# Altium footprint library Miscellaneous THD.PcbLib: 216 footprints (part 3 of 15)
Each footprint in its own frame and in the unit in brackets; x right, y up, seen from the top. Pads: shape width x height; smd on the part's side, far side on the other; paste and mask are expansions set on the pad; w line width, h text height; cw(c..) or ccw(c..) is an arc to the next point about the centre after c.
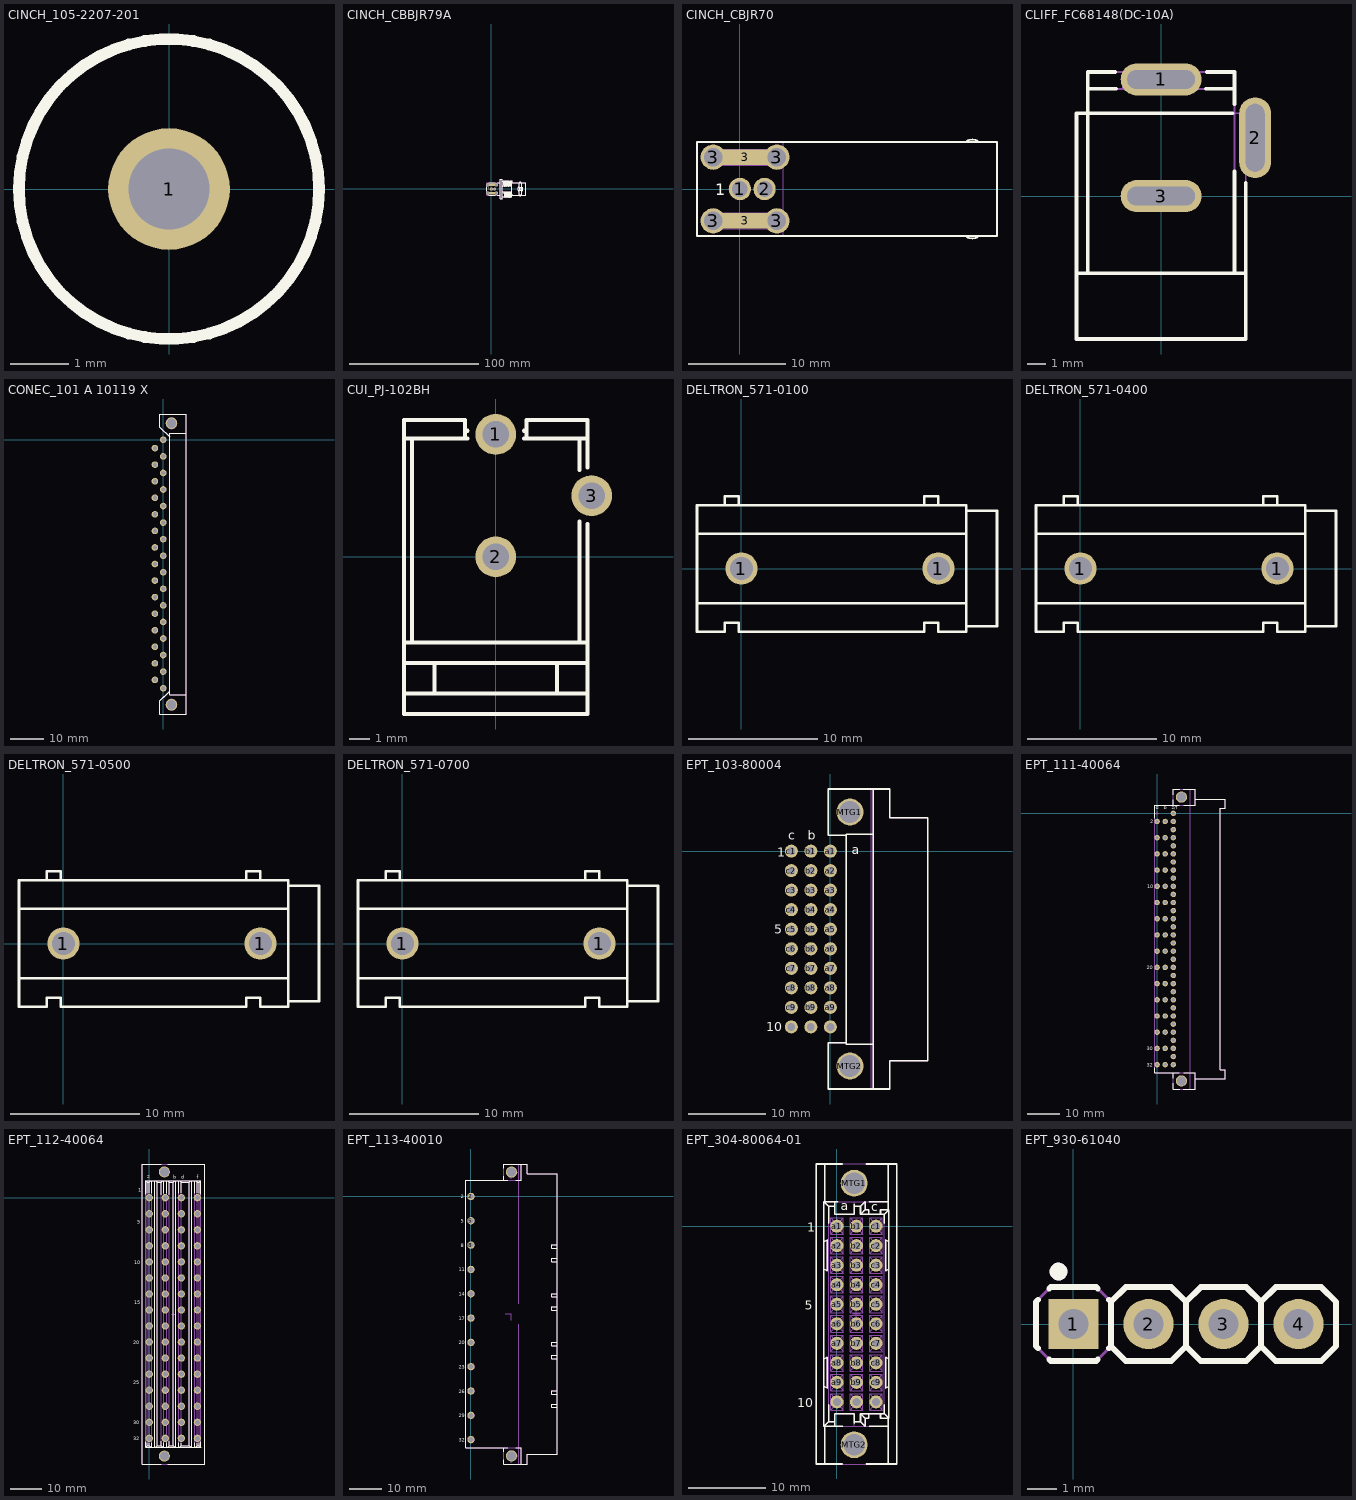
[diagram p2: the footprints below, top view; thin cyan lines are the x and y axes]

## CINCH_105-2207-201 [mm] "Yellow Tip Jack, Vertical For Banana 2mm"
height 8.26
pads (1):
  round 2.1 hole 1.4: 1(0,0)
Top Overlay:
  circle w0.2: c0,0 r2.59
Mechanical 8:
  circle w0.05: c0,0 r0.7
  lines w0.05: 0,0 0,0.5 0,0 ; 0,0 0,-0.5 0,0 ; 0,0 -0.5,0 0,0 ; 0,0 0.5,0 0,0
Mechanical 14:
  circle w0.1: c0,0 r2.59
3D body "CINCH_105-2207-201.stp": height 8.26, standoff -3.48, extent -2.59,-2.59 2.59,2.59

## CINCH_CBBJR79A [mm] "TRB Right Angle PCB Jack"
height 8.636
pads (8):
  round 2.3 hole 1.6: 1(0.2,0) 2(2.74,0)
  round 2.7 hole 2: 3(-2.54,-3.275) 3(-2.54,3.275) 3(4.01,-3.275) 3(4.01,3.275)
  oval 8.55x2 smd paste-1 mask-1: 3(0.733,-3.275) 3(0.733,3.275)
Top Overlay:
  drawing of 163 lines, arcs and shapes, not listed
  text "1" at -2.27,-0.635 h1.2
Mechanical 8:
  lines w0.2: -3.54,-3.275 -1.54,-3.275 ; -3.54,3.275 -1.54,3.275 ; -2.54,-4.275 -2.54,-2.275 ; -2.54,2.275 -2.54,4.275 ; -0.8,0 1.2,0 ; 0.2,-1 0.2,1 ; 0.27,0 2.27,0 ; 0.763,-0.707 2.177,0.707 ; 0.763,0.707 2.177,-0.707 ; 2.74,-1 2.74,1 ; 3.01,-3.275 5.01,-3.275 ; 3.01,3.275 5.01,3.275 ; 4.01,-4.275 4.01,-2.275 ; 4.01,2.275 4.01,4.275
Mechanical 14:
  drawing of 161 lines, arcs and shapes, not listed
  text "1" at -2.27,-0.635 h1.2
3D body "CINCH_CBBJR79A.stp": height 15.5, standoff -3.5, extent -3.289,-7.53 26.697,7.53
3D body "CINCH_CBBJR79A_part2.stp": height 17.38, standoff -1.68, extent 11.789,-8.256 14.147,8.256
3D body "CINCH_CBBJR79A_part3.stp": height 15.97, standoff -0.03, extent 10.945,-7.998 11.745,7.998

## CINCH_CBJR70 [mm] "TRB ( Twinax/Triax 500MHz) Right Angle PCB Jack"
height 10.92
pads (8):
  round 2.3 hole 1.6: 1(0,0) 2(2.54,0)
  round 2.6 hole 1.9: 3(-2.743,-3.277) 3(-2.743,3.277) 3(3.81,-3.277) 3(3.81,3.277)
  oval 8.203x1.6 smd paste-0.8 mask-0.8: 3(0.533,-3.277) 3(0.533,3.277)
Top Overlay:
  lines w0.2: 23.304,-4.826 ccw(c23.603,-4.676) 23.456,-4.976 ccw(c23.927,-3.968) 24.398,-4.976 ccw(c24.253,-4.679) 24.549,-4.826 ; 23.304,4.826 cw(c23.599,4.68) 23.456,4.976 cw(c23.927,3.968) 24.398,4.976 cw(c24.26,4.686) 24.549,4.826 ; -4.413,-4.826 26.467,-4.826 26.467,4.826 -4.413,4.826 -4.413,-4.826
  text "1" at -2.54,-0.635 h1.2
Mechanical 8:
  circle w0.1: c3.81,3.277 r0.825
  circle w0.1: c-2.743,3.277 r0.825
  circle w0.1: c3.81,-3.277 r0.825
  circle w0.1: c-2.743,-3.277 r0.825
  lines w0.1: -3.243,-3.277 -2.743,-3.277 ; -3.243,3.277 -2.743,3.277 ; -2.743,-4.102 3.81,-4.102 ; -2.743,-3.777 -2.743,-3.277 ; -2.743,-2.777 -2.743,-3.277 ; -2.743,-2.452 3.81,-2.452 ; -2.743,2.452 3.81,2.452 ; -2.743,2.777 -2.743,3.277 ; -2.743,3.777 -2.743,3.277 ; -2.743,4.102 3.81,4.102 ; -2.243,-3.277 -2.743,-3.277 ; -2.243,3.277 -2.743,3.277 ; -0.5,0 0,0 ; 0,-0.5 0,0 ; 0,0.5 0,0 ; 0.033,-3.277 0.533,-3.277 ; 0.033,3.277 0.533,3.277 ; 0.5,0 0,0 ; 0.533,-3.777 0.533,-3.277 ; 0.533,-2.777 0.533,-3.277 ; 0.533,2.777 0.533,3.277 ; 0.533,3.777 0.533,3.277 ; 1.033,-3.277 0.533,-3.277 ; 1.033,3.277 0.533,3.277 ; 2.04,0 2.54,0 ; 2.54,-0.5 2.54,0 ; 2.54,0.5 2.54,0 ; 3.04,0 2.54,0 ; 3.31,-3.277 3.81,-3.277 ; 3.31,3.277 3.81,3.277 ; 3.81,-3.777 3.81,-3.277 ; 3.81,-2.777 3.81,-3.277 ; 3.81,2.777 3.81,3.277 ; 3.81,3.777 3.81,3.277 ; 4.31,-3.277 3.81,-3.277 ; 4.31,3.277 3.81,3.277 ; -2.743,-3.785 cw(c-2.743,-3.277) -2.743,-2.769 3.81,-2.769 cw(c3.81,-3.277) 3.81,-3.785 -2.743,-3.785 ; -2.743,2.769 cw(c-2.743,3.277) -2.743,3.785 3.81,3.785 cw(c3.81,3.277) 3.81,2.769 -2.743,2.769
Mechanical 14:
  lines w0.1: 4.443,-4.826 4.443,4.826 ; 23.304,-4.826 ccw(c23.603,-4.676) 23.456,-4.976 ccw(c23.927,-3.968) 24.398,-4.976 ccw(c24.253,-4.679) 24.549,-4.826 ; 23.304,4.826 cw(c23.599,4.68) 23.456,4.976 cw(c23.927,3.968) 24.398,4.976 cw(c24.26,4.686) 24.549,4.826 ; -4.413,-4.826 26.467,-4.826 26.467,4.826 -4.413,4.826 -4.413,-4.826
  text "1" at -2.54,-0.635 h1.2
3D body "CINCH_CBJR70.stp": height 10.92, standoff -3.3, extent -4.413,-5.078 26.467,5.081

## CLIFF_FC68148(DC-10A) [mm] "12V /  5A, 2.1mm Diameter Pin, DC Power Socket With  Switch. DC10A Type"
height 11
pads (3):
  rrect100% 4.3x1.7 hole 1 slot 3.6 at 0 deg: 1(0,6.2) 3(0,0)
  rrect100% 1.7x4.3 hole 1 slot 3.6 at 90 deg: 2(5,3.1)
Top Overlay:
  lines w0.2: -4.5,-4.1 4.5,-4.1 ; -3.9,-4.1 -3.9,6.6 -2.431,6.6 ; -3.9,5.7 -2.391,5.7 ; 2.391,5.7 3.9,5.7 ; 2.431,6.6 3.9,6.6 3.9,4.88 ; 3.8,4.4 -4.5,4.4 -4.5,-7.6 4.5,-7.6 4.5,0.709 ; 3.9,-4.1 3.9,1.32
Mechanical 8:
  lines w0.1: -0.5,0 0,0 ; -0.5,6.2 0,6.2 ; 0,-0.5 0,0 ; 0,0.5 0,0 ; 0,5.7 0,6.2 ; 0,6.7 0,6.2 ; 0.5,0 0,0 ; 0.5,6.2 0,6.2 ; 4.5,3.1 5,3.1 ; 5,2.6 5,3.1 ; 5,3.6 5,3.1 ; 5.5,3.1 5,3.1 ; -1.5,-0.1 -1.5,0.1 1.5,0.1 1.5,-0.1 -1.5,-0.1 ; -1.4,5.7 1.4,5.7 1.4,6.2 -1.4,6.2 -1.4,5.7 ; -1.3,-0.5 cw(c-1.3,0) -1.3,0.5 1.3,0.5 cw(c1.3,0) 1.3,-0.5 -1.3,-0.5 ; -1.3,5.7 cw(c-1.3,6.2) -1.3,6.7 1.3,6.7 cw(c1.3,6.2) 1.3,5.7 -1.3,5.7 ; 4.5,1.8 ccw(c5,1.8) 5.5,1.8 5.5,4.4 ccw(c5,4.4) 4.5,4.4 4.5,1.8
Mechanical 14:
  lines w0.1: -4.5,-4.1 4.5,-4.1 ; -3.9,-4.1 -3.9,6.6 -1.4,6.6 -1.4,6.2 ; -3.9,5.7 3.9,5.7 ; -2.029,5.7 -2.029,6.2 1.971,6.2 1.971,5.7 ; -1.372,6.2 cw(c-1.025,6.15) -1.025,6.5 0.975,6.5 ; 0.967,6.5 cw(c0.967,6.15) 1.314,6.2 ; 1.4,6.2 1.4,6.6 3.9,6.6 3.9,-4.1 ; 4.5,1.9 5.2,1.9 5.2,4.4 -4.5,4.4 -4.5,-7.6 4.5,-7.6 4.5,4.4 ; 5,1.9 5,4.4
3D body "CLIFF_FC68148(DC-10A).stp": height 11, standoff -3.5, extent -4.5,-7.6 5.2,6.6

## CONEC_101 A 10119 X [mm] "DIN 41617, Pitch 2.5mm, 31 Contacts Right-Angled Male Connector"
height 8.5
pads (33):
  round 2 hole 1.3: 1(0,0) 2(-2.5,-2.5) 3(0,-5) 4(-2.5,-7.5) 5(0,-10) 6(-2.5,-12.5) 7(0,-15) 8(-2.5,-17.5) 9(0,-20) 10(-2.5,-22.5) 11(0,-25) 12(-2.5,-27.5) 13(0,-30) 14(-2.5,-32.5) 15(0,-35) 16(-2.5,-37.5) 17(0,-40) 18(-2.5,-42.5) 19(0,-45) 20(-2.5,-47.5) 21(0,-50) 22(-2.5,-52.5) 23(0,-55) 24(-2.5,-57.5) 25(0,-60) 26(-2.5,-62.5) 27(0,-65) 28(-2.5,-67.5) 29(0,-70) 30(-2.5,-72.5) 31(0,-75)
  round 3.5 / inner round 3.5 / far side round 5.1 hole 2.8: MTG1(2.5,5) MTG2(2.5,-80)
Top Overlay:
  lines w0.2: 0.916,-77 -1.1,-78.86 ; 2,-76 -1.1,-78.86 ; 2,1 -1.1,3.86 -1.1,7.8 7,7.8 7,-82.8 -1.1,-82.8 -1.1,-78.86 ; 7,-77 2,-77 2,2 7,2
Mechanical 8:
  lines w0.1: -3,-72.5 -2.5,-72.5 ; -3,-67.5 -2.5,-67.5 ; -3,-62.5 -2.5,-62.5 ; -3,-57.5 -2.5,-57.5 ; -3,-52.5 -2.5,-52.5 ; -3,-47.5 -2.5,-47.5 ; -3,-42.5 -2.5,-42.5 ; -3,-37.5 -2.5,-37.5 ; -3,-32.5 -2.5,-32.5 ; -3,-27.5 -2.5,-27.5 ; -3,-22.5 -2.5,-22.5 ; -3,-17.5 -2.5,-17.5 ; -3,-12.5 -2.5,-12.5 ; -3,-7.5 -2.5,-7.5 ; -3,-2.5 -2.5,-2.5 ; -2.5,-73 -2.5,-72.5 ; -2.5,-72 -2.5,-72.5 ; -2.5,-68 -2.5,-67.5 ; -2.5,-67 -2.5,-67.5 ; -2.5,-63 -2.5,-62.5 ; -2.5,-62 -2.5,-62.5 ; -2.5,-58 -2.5,-57.5 ; -2.5,-57 -2.5,-57.5 ; -2.5,-53 -2.5,-52.5 ; -2.5,-52 -2.5,-52.5 ; -2.5,-48 -2.5,-47.5 ; -2.5,-47 -2.5,-47.5 ; -2.5,-43 -2.5,-42.5 ; -2.5,-42 -2.5,-42.5 ; -2.5,-38 -2.5,-37.5 ; -2.5,-37 -2.5,-37.5 ; -2.5,-33 -2.5,-32.5 ; -2.5,-32 -2.5,-32.5 ; -2.5,-28 -2.5,-27.5 ; -2.5,-27 -2.5,-27.5 ; -2.5,-23 -2.5,-22.5 ; -2.5,-22 -2.5,-22.5 ; -2.5,-18 -2.5,-17.5 ; -2.5,-17 -2.5,-17.5 ; -2.5,-13 -2.5,-12.5 ; -2.5,-12 -2.5,-12.5 ; -2.5,-8 -2.5,-7.5 ; -2.5,-7 -2.5,-7.5 ; -2.5,-3 -2.5,-2.5 ; -2.5,-2 -2.5,-2.5 ; -2,-72.5 -2.5,-72.5 ; -2,-67.5 -2.5,-67.5 ; -2,-62.5 -2.5,-62.5 ; -2,-57.5 -2.5,-57.5 ; -2,-52.5 -2.5,-52.5 ; -2,-47.5 -2.5,-47.5 ; -2,-42.5 -2.5,-42.5 ; -2,-37.5 -2.5,-37.5 ; -2,-32.5 -2.5,-32.5 ; -2,-27.5 -2.5,-27.5 ; -2,-22.5 -2.5,-22.5 ; -2,-17.5 -2.5,-17.5 ; -2,-12.5 -2.5,-12.5 ; -2,-7.5 -2.5,-7.5 ; -2,-2.5 -2.5,-2.5 ; -0.5,-75 0,-75 ; -0.5,-70 0,-70 ; -0.5,-65 0,-65 ; -0.5,-60 0,-60 ; -0.5,-55 0,-55 ; -0.5,-50 0,-50 ; -0.5,-45 0,-45 ; -0.5,-40 0,-40 ; -0.5,-35 0,-35 ; -0.5,-30 0,-30 ; -0.5,-25 0,-25 ; -0.5,-20 0,-20 ; -0.5,-15 0,-15 ; -0.5,-10 0,-10 ; -0.5,-5 0,-5 ; -0.5,0 0,0 ; 0,-75.5 0,-75 ; 0,-74.5 0,-75 ; 0,-70.5 0,-70 ; 0,-69.5 0,-70 ; 0,-65.5 0,-65 ; 0,-64.5 0,-65 ; 0,-60.5 0,-60 ; 0,-59.5 0,-60 ; 0,-55.5 0,-55 ; 0,-54.5 0,-55 ; 0,-50.5 0,-50 ; 0,-49.5 0,-50 ; 0,-45.5 0,-45 ; 0,-44.5 0,-45 ; 0,-40.5 0,-40 ; 0,-39.5 0,-40 ; 0,-35.5 0,-35 ; 0,-34.5 0,-35 ; 0,-30.5 0,-30 ; 0,-29.5 0,-30 ; 0,-25.5 0,-25 ; 0,-24.5 0,-25 ; 0,-20.5 0,-20 ; 0,-19.5 0,-20 ; 0,-15.5 0,-15 ; 0,-14.5 0,-15 ; 0,-10.5 0,-10 ; 0,-9.5 0,-10 ; 0,-5.5 0,-5 ; 0,-4.5 0,-5 ; 0,-0.5 0,0 ; 0,0.5 0,0 ; 0.5,-75 0,-75 ; 0.5,-70 0,-70 ; 0.5,-65 0,-65 ; 0.5,-60 0,-60 ; 0.5,-55 0,-55 ; 0.5,-50 0,-50 ; 0.5,-45 0,-45 ; 0.5,-40 0,-40 ; 0.5,-35 0,-35 ; 0.5,-30 0,-30 ; 0.5,-25 0,-25 ; 0.5,-20 0,-20 ; 0.5,-15 0,-15 ; 0.5,-10 0,-10 ; 0.5,-5 0,-5 ; 0.5,0 0,0 ; 2,-80 2.5,-80 ; 2,5 2.5,5 ; 2.5,-80.5 2.5,-80 ; 2.5,-79.5 2.5,-80 ; 2.5,4.5 2.5,5 ; 2.5,5.5 2.5,5 ; 3,-80 2.5,-80 ; 3,5 2.5,5
Mechanical 14:
  lines w0.1: 0.916,-77 -1.1,-78.86 ; 2,-76 -1.1,-78.86 ; 2,1 -1.1,3.86 -1.1,7.8 7,7.8 7,-82.8 -1.1,-82.8 -1.1,-78.86 ; 7,-77 2,-77 2,2 7,2 ; 1.1,-80.775 ccw(c2.5,-80) 3.9,-80.775 3.9,-79.225 ccw(c2.5,-80) 1.1,-79.225 1.1,-80.775 ; 1.1,4.225 ccw(c2.5,5) 3.9,4.225 3.9,5.775 ccw(c2.5,5) 1.1,5.775 1.1,4.225
3D body "CONEC_101 B 10119 X.stp": height 8.5, standoff -3.3, extent -3,-82.8 14.2,7.8

## CUI_PJ-102BH [mm] "2.5 mm Center Pin, 5A, 24V Right Angle, Through Hole, Tapered Pins, DC Power Jack Connector"
height 11
pads (3):
  round 2 hole 1.3: 1(0,6) 2(0,0) 3(4.7,3)
Top Overlay:
  lines w0.2: -4.5,-6.7 4.5,-6.7 ; -4.5,-5.2 4.5,-5.2 ; -4.5,-4.2 4.5,-4.2 ; -4.5,5.8 -1.386,5.8 -1.5,5.8 -1.5,6.7 -4.5,6.7 -4.5,-7.7 4.5,-7.7 4.5,1.614 ; -4.1,-4.2 -4.1,5.8 ; -3,-6.7 -3,-5.2 ; -1.5,6.179 -1.389,6.179 ; 1.388,6.18 1.5,6.18 ; 3,-6.7 3,-5.2 ; 4.1,-4.2 4.1,1.735 ; 4.1,4.265 4.1,5.8 ; 4.5,4.386 4.5,6.7 1.5,6.7 1.5,5.8 1.386,5.8 4.5,5.8
Mechanical 8:
  circle w0.1: c4.7,3 r0.65
  circle w0.1: c0,6 r0.65
  circle w0.1: c0,0 r0.65
  lines w0.1: -0.5,0 0,0 ; -0.5,6 0,6 ; 0,-0.5 0,0 ; 0,0.5 0,0 ; 0,5.5 0,6 ; 0,6.5 0,6 ; 0.5,0 0,0 ; 0.5,6 0,6 ; 4.2,3 4.7,3 ; 4.7,2.5 4.7,3 ; 4.7,3.5 4.7,3 ; 5.2,3 4.7,3
3D body "CUI_PJ-102BH.stp": height 11, standoff -3.5, extent -4.5,-7.7 4.9,6.7

## DELTRON_571-0100 [mm] "Black Insulated Ø 4mm Angled Socket For Banana 4mm"
height 12.4
pads (2):
  round 2.5 hole 1.8: 1(0,0) 1(15.3,0)
Top Overlay:
  lines w0.2: -3.45,-2.7 17.45,-2.7 ; -3.45,2.7 17.45,2.7 ; -1.3,4.9 -1.3,5.6 -0.2,5.6 -0.2,4.9 ; 14.2,4.9 14.2,5.6 15.3,5.6 15.3,4.9 ; 17.45,-4.5 19.85,-4.5 19.85,4.5 17.45,4.5 ; -3.45,-4.9 -3.45,4.9 ; -3.45,-4.9 -1.3,-4.9 -1.3,-4.2 -0.2,-4.2 -0.2,-4.9 14.2,-4.9 14.2,-4.2 15.3,-4.2 15.3,-4.9 17.45,-4.9 17.45,4.9 -3.45,4.9 ; -3.45,-4.9 -3.45,4.9
Mechanical 8:
  lines w0.1: -0.5,0 0,0 ; 0,-0.5 0,0 ; 0,0.5 0,0 ; 0.5,0 0,0 ; 14.8,0 15.3,0 ; 15.3,-0.5 15.3,0 ; 15.3,0.5 15.3,0 ; 15.8,0 15.3,0
Mechanical 14:
  lines w0.1: -3.45,-2.7 17.45,-2.7 ; -3.45,2.7 17.45,2.7 ; -1.3,4.9 -1.3,5.6 -0.2,5.6 -0.2,4.9 ; 14.2,4.9 14.2,5.6 15.3,5.6 15.3,4.9 ; 17.45,-4.5 19.85,-4.5 19.85,4.5 17.45,4.5 ; -3.45,-4.9 -3.45,4.9 ; -3.45,-4.9 -1.3,-4.9 -1.3,-4.2 -0.2,-4.2 -0.2,-4.9 14.2,-4.9 14.2,-4.2 15.3,-4.2 15.3,-4.9 17.45,-4.9 17.45,4.9 -3.45,4.9 ; -3.45,-4.9 -3.45,4.9
3D body "DELTRON_571-0100.stp": height 12.4, standoff -3.8, extent -3.45,-4.9 19.85,5.6

## DELTRON_571-0400 [mm] "Green Insulated Ø 4mm Angled Socket For Banana 4mm"
height 12.4
pads (2):
  round 2.5 hole 1.8: 1(0,0) 1(15.3,0)
Top Overlay:
  lines w0.2: -3.45,-2.7 17.45,-2.7 ; -3.45,2.7 17.45,2.7 ; -1.3,4.9 -1.3,5.6 -0.2,5.6 -0.2,4.9 ; 14.2,4.9 14.2,5.6 15.3,5.6 15.3,4.9 ; 17.45,-4.5 19.85,-4.5 19.85,4.5 17.45,4.5 ; -3.45,-4.9 -3.45,4.9 ; -3.45,-4.9 -1.3,-4.9 -1.3,-4.2 -0.2,-4.2 -0.2,-4.9 14.2,-4.9 14.2,-4.2 15.3,-4.2 15.3,-4.9 17.45,-4.9 17.45,4.9 -3.45,4.9 ; -3.45,-4.9 -3.45,4.9
Mechanical 8:
  lines w0.1: -0.5,0 0,0 ; 0,-0.5 0,0 ; 0,0.5 0,0 ; 0.5,0 0,0 ; 14.8,0 15.3,0 ; 15.3,-0.5 15.3,0 ; 15.3,0.5 15.3,0 ; 15.8,0 15.3,0
Mechanical 14:
  lines w0.1: -3.45,-2.7 17.45,-2.7 ; -3.45,2.7 17.45,2.7 ; -1.3,4.9 -1.3,5.6 -0.2,5.6 -0.2,4.9 ; 14.2,4.9 14.2,5.6 15.3,5.6 15.3,4.9 ; 17.45,-4.5 19.85,-4.5 19.85,4.5 17.45,4.5 ; -3.45,-4.9 -3.45,4.9 ; -3.45,-4.9 -1.3,-4.9 -1.3,-4.2 -0.2,-4.2 -0.2,-4.9 14.2,-4.9 14.2,-4.2 15.3,-4.2 15.3,-4.9 17.45,-4.9 17.45,4.9 -3.45,4.9 ; -3.45,-4.9 -3.45,4.9
3D body "DELTRON_571-0400.stp": height 12.4, standoff -3.8, extent -3.45,-4.9 19.85,5.6

## DELTRON_571-0500 [mm] "Red Insulated Ø 4mm Angled Socket For Banana 4mm"
height 12.4
pads (2):
  round 2.5 hole 1.8: 1(0,0) 1(15.3,0)
Top Overlay:
  lines w0.2: -3.45,-2.7 17.45,-2.7 ; -3.45,2.7 17.45,2.7 ; -1.3,4.9 -1.3,5.6 -0.2,5.6 -0.2,4.9 ; 14.2,4.9 14.2,5.6 15.3,5.6 15.3,4.9 ; 17.45,-4.5 19.85,-4.5 19.85,4.5 17.45,4.5 ; -3.45,-4.9 -3.45,4.9 ; -3.45,-4.9 -1.3,-4.9 -1.3,-4.2 -0.2,-4.2 -0.2,-4.9 14.2,-4.9 14.2,-4.2 15.3,-4.2 15.3,-4.9 17.45,-4.9 17.45,4.9 -3.45,4.9 ; -3.45,-4.9 -3.45,4.9
Mechanical 8:
  lines w0.1: -0.5,0 0,0 ; 0,-0.5 0,0 ; 0,0.5 0,0 ; 0.5,0 0,0 ; 14.8,0 15.3,0 ; 15.3,-0.5 15.3,0 ; 15.3,0.5 15.3,0 ; 15.8,0 15.3,0
Mechanical 14:
  lines w0.1: -3.45,-2.7 17.45,-2.7 ; -3.45,2.7 17.45,2.7 ; -1.3,4.9 -1.3,5.6 -0.2,5.6 -0.2,4.9 ; 14.2,4.9 14.2,5.6 15.3,5.6 15.3,4.9 ; 17.45,-4.5 19.85,-4.5 19.85,4.5 17.45,4.5 ; -3.45,-4.9 -3.45,4.9 ; -3.45,-4.9 -1.3,-4.9 -1.3,-4.2 -0.2,-4.2 -0.2,-4.9 14.2,-4.9 14.2,-4.2 15.3,-4.2 15.3,-4.9 17.45,-4.9 17.45,4.9 -3.45,4.9 ; -3.45,-4.9 -3.45,4.9
3D body "DELTRON_571-0500.stp": height 12.4, standoff -3.8, extent -3.45,-4.9 19.85,5.6

## DELTRON_571-0700 [mm] "Yellow Insulated Ø 4mm Angled Socket For Banana 4mm"
height 12.4
pads (2):
  round 2.5 hole 1.8: 1(0,0) 1(15.3,0)
Top Overlay:
  lines w0.2: -3.45,-2.7 17.45,-2.7 ; -3.45,2.7 17.45,2.7 ; -1.3,4.9 -1.3,5.6 -0.2,5.6 -0.2,4.9 ; 14.2,4.9 14.2,5.6 15.3,5.6 15.3,4.9 ; 17.45,-4.5 19.85,-4.5 19.85,4.5 17.45,4.5 ; -3.45,-4.9 -3.45,4.9 ; -3.45,-4.9 -1.3,-4.9 -1.3,-4.2 -0.2,-4.2 -0.2,-4.9 14.2,-4.9 14.2,-4.2 15.3,-4.2 15.3,-4.9 17.45,-4.9 17.45,4.9 -3.45,4.9 ; -3.45,-4.9 -3.45,4.9
Mechanical 8:
  lines w0.1: -0.5,0 0,0 ; 0,-0.5 0,0 ; 0,0.5 0,0 ; 0.5,0 0,0 ; 14.8,0 15.3,0 ; 15.3,-0.5 15.3,0 ; 15.3,0.5 15.3,0 ; 15.8,0 15.3,0
Mechanical 14:
  lines w0.1: -3.45,-2.7 17.45,-2.7 ; -3.45,2.7 17.45,2.7 ; -1.3,4.9 -1.3,5.6 -0.2,5.6 -0.2,4.9 ; 14.2,4.9 14.2,5.6 15.3,5.6 15.3,4.9 ; 17.45,-4.5 19.85,-4.5 19.85,4.5 17.45,4.5 ; -3.45,-4.9 -3.45,4.9 ; -3.45,-4.9 -1.3,-4.9 -1.3,-4.2 -0.2,-4.2 -0.2,-4.9 14.2,-4.9 14.2,-4.2 15.3,-4.2 15.3,-4.9 17.45,-4.9 17.45,4.9 -3.45,4.9 ; -3.45,-4.9 -3.45,4.9
3D body "DELTRON_571-0700.stp": height 12.4, standoff -3.8, extent -3.45,-4.9 19.85,5.6

## EPT_103-80004 [mm] "Right Angled Connector; DIN 41612, Type C/3, Thru-Hole; Rows a+b+c, 30 Male Contacts"
height 10.95
pads (32):
  round 1.7 hole 1: a1(0,0) a2(0,-2.54) a3(0,-5.08) a4(0,-7.62) a5(0,-10.16) a6(0,-12.7) a7(0,-15.24) a8(0,-17.78) a9(0,-20.32) a10(0,-22.86) b1(-2.54,0) b2(-2.54,-2.54) b3(-2.54,-5.08) b4(-2.54,-7.62) b5(-2.54,-10.16) b6(-2.54,-12.7) b7(-2.54,-15.24) b8(-2.54,-17.78) b9(-2.54,-20.32) b10(-2.54,-22.86) c1(-5.08,0) c2(-5.08,-2.54) c3(-5.08,-5.08) c4(-5.08,-7.62) c5(-5.08,-10.16) c6(-5.08,-12.7) c7(-5.08,-15.24) c8(-5.08,-17.78) c9(-5.08,-20.32) c10(-5.08,-22.86)
  round 3.5 / inner round 3.5 / far side round 5.1 hole 2.8: MTG1(2.54,5.08) MTG2(2.54,-27.94)
Top Overlay:
  lines w0.2: 2.04,-24.93 -0.31,-24.93 -0.31,-30.93 7.74,-30.93 7.74,-27.28 12.64,-27.28 12.64,4.32 7.74,4.32 7.74,8.07 -0.31,8.07 -0.31,2.07 2.04,2.07 ; 5.59,-30.93 5.59,8.07 ; 5.59,-25.14 2.04,-25.14 2.04,2.18 5.59,2.18
  text "b" at -2.94,1.48 h1.2
  text "c" at -5.465,1.48 h1.2
  text "10" at -8.327,-23.435 h1.2
  text "5" at -7.304,-10.76 h1.2
  text "1" at -6.919,-0.725 h1.2
  text "a" at 2.785,-0.395 h1.2
Mechanical 8:
  lines w0.1: -5.58,-22.86 -5.08,-22.86 ; -5.58,-20.32 -5.08,-20.32 ; -5.58,-17.78 -5.08,-17.78 ; -5.58,-15.24 -5.08,-15.24 ; -5.58,-12.7 -5.08,-12.7 ; -5.58,-10.16 -5.08,-10.16 ; -5.58,-7.62 -5.08,-7.62 ; -5.58,-5.08 -5.08,-5.08 ; -5.58,-2.54 -5.08,-2.54 ; -5.58,0 -5.08,0 ; -5.08,-23.36 -5.08,-22.86 ; -5.08,-22.36 -5.08,-22.86 ; -5.08,-20.82 -5.08,-20.32 ; -5.08,-19.82 -5.08,-20.32 ; -5.08,-18.28 -5.08,-17.78 ; -5.08,-17.28 -5.08,-17.78 ; -5.08,-15.74 -5.08,-15.24 ; -5.08,-14.74 -5.08,-15.24 ; -5.08,-13.2 -5.08,-12.7 ; -5.08,-12.2 -5.08,-12.7 ; -5.08,-10.66 -5.08,-10.16 ; -5.08,-9.66 -5.08,-10.16 ; -5.08,-8.12 -5.08,-7.62 ; -5.08,-7.12 -5.08,-7.62 ; -5.08,-5.58 -5.08,-5.08 ; -5.08,-4.58 -5.08,-5.08 ; -5.08,-3.04 -5.08,-2.54 ; -5.08,-2.04 -5.08,-2.54 ; -5.08,-0.5 -5.08,0 ; -5.08,0.5 -5.08,0 ; -4.58,-22.86 -5.08,-22.86 ; -4.58,-20.32 -5.08,-20.32 ; -4.58,-17.78 -5.08,-17.78 ; -4.58,-15.24 -5.08,-15.24 ; -4.58,-12.7 -5.08,-12.7 ; -4.58,-10.16 -5.08,-10.16 ; -4.58,-7.62 -5.08,-7.62 ; -4.58,-5.08 -5.08,-5.08 ; -4.58,-2.54 -5.08,-2.54 ; -4.58,0 -5.08,0 ; -3.04,-22.86 -2.54,-22.86 ; -3.04,-20.32 -2.54,-20.32 ; -3.04,-17.78 -2.54,-17.78 ; -3.04,-15.24 -2.54,-15.24 ; -3.04,-12.7 -2.54,-12.7 ; -3.04,-10.16 -2.54,-10.16 ; -3.04,-7.62 -2.54,-7.62 ; -3.04,-5.08 -2.54,-5.08 ; -3.04,-2.54 -2.54,-2.54 ; -3.04,0 -2.54,0 ; -2.54,-23.36 -2.54,-22.86 ; -2.54,-22.36 -2.54,-22.86 ; -2.54,-20.82 -2.54,-20.32 ; -2.54,-19.82 -2.54,-20.32 ; -2.54,-18.28 -2.54,-17.78 ; -2.54,-17.28 -2.54,-17.78 ; -2.54,-15.74 -2.54,-15.24 ; -2.54,-14.74 -2.54,-15.24 ; -2.54,-13.2 -2.54,-12.7 ; -2.54,-12.2 -2.54,-12.7 ; -2.54,-10.66 -2.54,-10.16 ; -2.54,-9.66 -2.54,-10.16 ; -2.54,-8.12 -2.54,-7.62 ; -2.54,-7.12 -2.54,-7.62 ; -2.54,-5.58 -2.54,-5.08 ; -2.54,-4.58 -2.54,-5.08 ; -2.54,-3.04 -2.54,-2.54 ; -2.54,-2.04 -2.54,-2.54 ; -2.54,-0.5 -2.54,0 ; -2.54,0.5 -2.54,0 ; -2.04,-22.86 -2.54,-22.86 ; -2.04,-20.32 -2.54,-20.32 ; -2.04,-17.78 -2.54,-17.78 ; -2.04,-15.24 -2.54,-15.24 ; -2.04,-12.7 -2.54,-12.7 ; -2.04,-10.16 -2.54,-10.16 ; -2.04,-7.62 -2.54,-7.62 ; -2.04,-5.08 -2.54,-5.08 ; -2.04,-2.54 -2.54,-2.54 ; -2.04,0 -2.54,0 ; -0.5,-22.86 0,-22.86 ; -0.5,-20.32 0,-20.32 ; -0.5,-17.78 0,-17.78 ; -0.5,-15.24 0,-15.24 ; -0.5,-12.7 0,-12.7 ; -0.5,-10.16 0,-10.16 ; -0.5,-7.62 0,-7.62 ; -0.5,-5.08 0,-5.08 ; -0.5,-2.54 0,-2.54 ; -0.5,0 0,0 ; 0,-23.36 0,-22.86 ; 0,-22.36 0,-22.86 ; 0,-20.82 0,-20.32 ; 0,-19.82 0,-20.32 ; 0,-18.28 0,-17.78 ; 0,-17.28 0,-17.78 ; 0,-15.74 0,-15.24 ; 0,-14.74 0,-15.24 ; 0,-13.2 0,-12.7 ; 0,-12.2 0,-12.7 ; 0,-10.66 0,-10.16 ; 0,-9.66 0,-10.16 ; 0,-8.12 0,-7.62 ; 0,-7.12 0,-7.62 ; 0,-5.58 0,-5.08 ; 0,-4.58 0,-5.08 ; 0,-3.04 0,-2.54 ; 0,-2.04 0,-2.54 ; 0,-0.5 0,0 ; 0,0.5 0,0 ; 0.5,-22.86 0,-22.86 ; 0.5,-20.32 0,-20.32 ; 0.5,-17.78 0,-17.78 ; 0.5,-15.24 0,-15.24 ; 0.5,-12.7 0,-12.7 ; 0.5,-10.16 0,-10.16 ; 0.5,-7.62 0,-7.62 ; 0.5,-5.08 0,-5.08 ; 0.5,-2.54 0,-2.54 ; 0.5,0 0,0 ; 2.04,-27.94 2.54,-27.94 ; 2.04,5.08 2.54,5.08 ; 2.54,-28.44 2.54,-27.94 ; 2.54,-27.44 2.54,-27.94 ; 2.54,4.58 2.54,5.08 ; 2.54,5.58 2.54,5.08 ; 3.04,-27.94 2.54,-27.94 ; 3.04,5.08 2.54,5.08 ; 5.3,-30.93 5.3,-11.43 ; 5.3,-30.78 5.3,-11.43 ; 5.3,7.92 5.3,-11.43 ; 5.3,8.07 5.3,-11.43